# Altium footprint library Connectors.PcbLib: 133 footprints (part 3 of 9)
Each footprint in its own frame and in the unit in brackets; x right, y up, seen from the top. Pads: shape width x height; smd on the part's side, far side on the other; paste and mask are expansions set on the pad; w line width, h text height; cw(c..) or ccw(c..) is an arc to the next point about the centre after c.
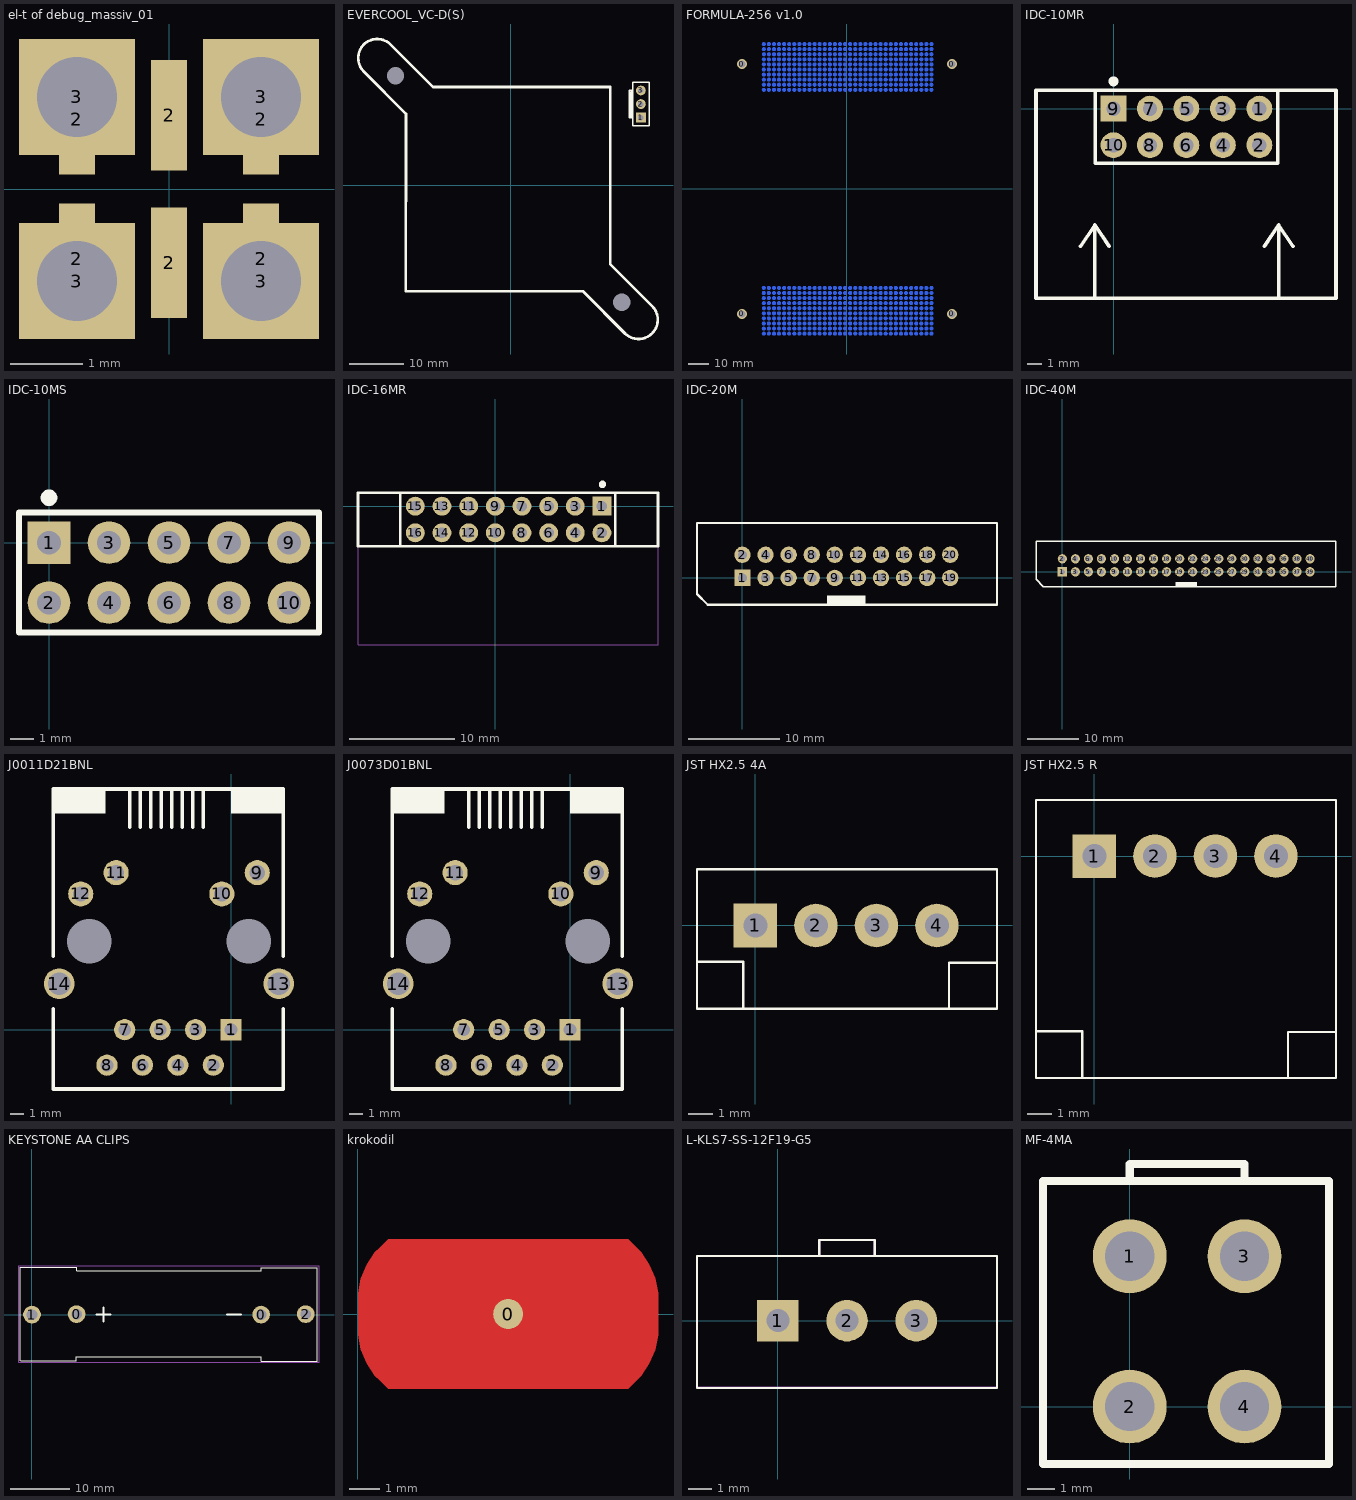
[diagram p2: the footprints below, top view; thin cyan lines are the x and y axes]

## el-t of debug_massiv_01 [mm]
pads (10):
  rect 0.5x1.524 all layers, no hole: 2(-1.27,-0.965) 2(-1.27,0.965) 2(0,-1.016) 2(0,1.016) 2(1.27,-0.965) 2(1.27,0.965)
  rect 1.6x1.6 hole 1.1: 3(-1.27,-1.27) 3(-1.27,1.27) 3(1.27,-1.27) 3(1.27,1.27)

## EVERCOOL_VC-D(S) [mm]
pads (5):
  rect 1.8x1.8 hole 1: 1(24,12.5)
  round 1.8 hole 1: 2(24,15) 3(24,17.5)
  round 0 hole 3.2 unplated mask+1.7: NPTH(-21.219,20.219) NPTH(20.5,-21.5)
Top Overlay:
  lines w0.254: 22.1,17.3 22.1,12.5 22.5,12.5 21.9,12.5 21.9,17.5 22.4,17.5 22.4,12.5 22.2,12.5 22.2,17.5 22.5,17.5 22.5,19 ; 22.5,19 22.5,11 25.5,11 25.5,19 22.5,19
  lines w0.5: -27.079,21.025 cw(c-24.602,23.493) -22.13,25.965 -14.317,18.152 18.334,18.152 18.334,-14.499 26.147,-22.312 cw(c23.561,-24.752) 21.117,-27.334 13.317,-19.507 -19.334,-19.452 -19.278,13.198 -27.079,21.025
3D body "EVERCOOL_40x10_fan.STEP": height 19.92, standoff -5.62, extent -28.045,-28.27 27.203,26.978

## FORMULA-256 v1.0 [mm] "Контактирующее для формулы"
pads (684):
  round 5 hole 3.4: 0(-52.5,-62.57) 0(-52.5,62.43) 0(52.5,-62.57) 0(52.5,62.43)
  round 1.8 smd far side: 1(-41.6,-54.61) 2(-39.06,-54.61) 3(-36.52,-54.61) 4(-33.98,-54.61) 5(-31.44,-54.61) 6(-28.9,-54.61) 7(-26.36,-54.61) 8(-23.82,-54.61) 9(-21.28,-54.61) 10(-18.74,-54.61) 11(-16.2,-54.61) 12(-13.66,-54.61) 13(-11.12,-54.61) 14(-8.58,-54.61) 15(-6.04,-54.61) 16(-3.5,-54.61) 18(1.58,-54.61) 19(4.12,-54.61) 20(6.66,-54.61) 21(9.2,-54.61) 22(11.739,-54.61) 23(14.28,-54.61) 24(16.82,-54.61) 25(19.36,-54.61) 26(21.9,-54.61) 27(24.44,-54.61) 28(26.98,-54.61) 29(29.52,-54.61) 30(32.06,-54.61) 31(34.6,-54.61) 32(37.14,-54.61) 33(39.68,-54.61) 69(42.22,54.61) 70(39.68,54.61) 71(37.14,54.61) 72(34.6,54.61) 73(32.06,54.61) 74(29.52,54.61) 75(26.98,54.61) 76(24.44,54.61) 77(21.9,54.61) 78(19.36,54.61) 79(16.82,54.61) 80(14.28,54.61) 81(11.739,54.61) 82(9.2,54.61) 83(6.66,54.61) 84(4.12,54.61) 86(-0.96,54.61) 87(-3.5,54.61) 88(-6.04,54.61) 89(-8.58,54.61) 90(-11.12,54.61) 91(-13.66,54.61) 92(-16.2,54.61) 93(-18.74,54.61) 94(-21.28,54.61) 95(-23.82,54.61) 96(-26.36,54.61) 97(-28.9,54.61) 98(-31.44,54.61) 99(-33.98,54.61) 100(-36.52,54.61) 101(-39.06,54.61) 137(-41.6,-59.69) 138(-39.06,-59.69) 139(-36.52,-59.69) 140(-33.98,-59.69) 141(-31.44,-59.69) 142(-28.9,-59.69) 143(-26.36,-59.69) 144(-23.82,-59.69) 145(-21.28,-59.69) 146(-18.74,-59.69) 147(-16.2,-59.69) 148(-13.66,-59.69) 149(-11.12,-59.69) 150(-8.58,-59.69) 151(-6.04,-59.69) 152(-3.5,-59.69) 153(-0.96,-59.69) 154(1.58,-59.69) 155(4.12,-59.69) 156(6.66,-59.69) 157(9.2,-59.69) 158(11.739,-59.69) 159(14.28,-59.69) 160(16.82,-59.69) 161(19.36,-59.69) 162(21.9,-59.69) 163(24.44,-59.69) 164(26.98,-59.69) 165(29.52,-59.69) 166(32.06,-59.69) 167(34.6,-59.69) 168(37.14,-59.69) 169(39.68,-59.69) 170(42.22,-59.69) 205(42.22,59.69) 206(39.68,59.69) 207(37.14,59.69) 208(34.6,59.69) 209(32.06,59.69) 210(29.52,59.69) 211(26.98,59.69) 212(24.44,59.69) 213(21.9,59.69) 214(19.36,59.69) 215(16.82,59.69) 216(14.28,59.69) 217(11.739,59.69) 218(9.2,59.69) 219(6.66,59.69) 220(4.12,59.69) 221(1.58,59.69) 222(-0.96,59.69) 223(-3.5,59.69) 224(-6.04,59.69) 225(-8.58,59.69) 226(-11.12,59.69) 227(-13.66,59.69) 228(-16.2,59.69) 229(-18.74,59.69) 230(-21.28,59.69) 231(-23.82,59.69) 232(-26.36,59.69) 233(-28.9,59.69) 234(-31.44,59.69) 235(-33.98,59.69) 236(-36.52,59.69) 237(-39.06,59.69) 238(-41.6,59.69) 273(-41.6,-64.77) 274(-39.06,-64.77) 275(-36.52,-64.77) 276(-33.98,-64.77) 277(-31.44,-64.77) 278(-28.9,-64.77) 279(-26.36,-64.77) 280(-23.82,-64.77) 281(-21.28,-64.77) 282(-18.74,-64.77) 283(-16.2,-64.77) 284(-13.66,-64.77) 285(-11.12,-64.77) 286(-8.58,-64.77) 287(-6.04,-64.77) 288(-3.5,-64.77) 289(-0.96,-64.77) 290(1.58,-64.77) 291(4.12,-64.77) 292(6.66,-64.77) 293(9.2,-64.77) 294(11.739,-64.77) 295(14.28,-64.77) 296(16.82,-64.77) 297(19.36,-64.77) 298(21.9,-64.77) 299(24.44,-64.77) 300(26.98,-64.77) 301(29.52,-64.77) 302(32.06,-64.77) 303(34.6,-64.77) 304(37.14,-64.77) 305(39.68,-64.77) 306(42.22,-64.77) 341(42.22,64.77) 342(39.68,64.77) 343(37.14,64.77) 344(34.6,64.77) 345(32.06,64.77) 346(29.52,64.77) 347(26.98,64.77) 348(24.44,64.77) 349(21.9,64.77) 350(19.36,64.77) 351(16.82,64.77) 352(14.28,64.77) 353(11.739,64.77) 354(9.2,64.77) 355(6.66,64.77) 356(4.12,64.77) 357(1.58,64.77) 358(-0.96,64.77) 359(-3.5,64.77) 360(-6.04,64.77) 361(-8.58,64.77) 362(-11.12,64.77) 363(-13.66,64.77) 364(-16.2,64.77) 365(-18.74,64.77) 366(-21.28,64.77) 367(-23.82,64.77) 368(-26.36,64.77) 369(-28.9,64.77) 370(-31.44,64.77) 371(-33.98,64.77) 372(-36.52,64.77) 373(-39.06,64.77) 374(-41.6,64.77) 409(-41.6,-69.85) 410(-39.06,-69.85) 411(-36.52,-69.85) 412(-33.98,-69.85) 413(-31.44,-69.85) 414(-28.9,-69.85) 415(-26.36,-69.85) 416(-23.82,-69.85) 417(-21.28,-69.85) 418(-18.74,-69.85) 419(-16.2,-69.85) 420(-13.66,-69.85) 421(-11.12,-69.85) 422(-8.58,-69.85) 423(-6.04,-69.85) 424(-3.5,-69.85) 425(-0.96,-69.85) 426(1.58,-69.85) 427(4.12,-69.85) 428(6.66,-69.85) 429(9.2,-69.85) 430(11.739,-69.85) 431(14.28,-69.85) 432(16.82,-69.85) 433(19.36,-69.85) 434(21.9,-69.85) 435(24.44,-69.85) 436(26.98,-69.85) 437(29.52,-69.85) 438(32.06,-69.85) 439(34.6,-69.85) 440(37.14,-69.85) 441(39.68,-69.85) 442(42.22,-69.85) 477(42.22,69.85) 478(39.68,69.85) 479(37.14,69.85) 480(34.6,69.85) 481(32.06,69.85) 482(29.52,69.85) 483(26.98,69.85) 484(24.44,69.85) 485(21.9,69.85) 486(19.36,69.85) 487(16.82,69.85) 488(14.28,69.85) 489(11.739,69.85) 490(9.2,69.85) 491(6.66,69.85) 492(4.12,69.85) 493(1.58,69.85) 494(-0.96,69.85) 495(-3.5,69.85) 496(-6.04,69.85) 497(-8.58,69.85) 498(-11.12,69.85) 499(-13.66,69.85) 500(-16.2,69.85) 501(-18.74,69.85) 502(-21.28,69.85) 503(-23.82,69.85) 504(-26.36,69.85) 505(-28.9,69.85) 506(-31.44,69.85) 507(-33.98,69.85) 508(-36.52,69.85) 509(-39.06,69.85) 510(-41.6,69.85) 545(-41.6,-49.53) 546(-39.06,-49.53) 547(-36.52,-49.53) 548(-33.98,-49.53) 549(-31.44,-49.53) 550(-28.9,-49.53) 551(-26.36,-49.53) 552(-23.82,-49.53) 553(-21.28,-49.53) 554(-18.74,-49.53) 555(-16.2,-49.53) 556(-13.66,-49.53) 557(-11.12,-49.53) 558(-8.58,-49.53) 559(-6.04,-49.53) 560(-3.5,-49.53) 561(-0.96,-49.53) 562(1.58,-49.53) 563(4.12,-49.53) 564(6.66,-49.53) 565(9.2,-49.53) 566(11.739,-49.53) 567(14.28,-49.53) 568(16.82,-49.53) 569(19.36,-49.53) 570(21.9,-49.53) 571(24.44,-49.53) 572(26.98,-49.53) 573(29.52,-49.53) 574(32.06,-49.53) 575(34.6,-49.53) 576(37.14,-49.53) 577(39.68,-49.53) 578(42.22,-49.53) 579(-41.6,-52.07) 580(-39.06,-52.07) 581(-36.52,-52.07) 582(-33.98,-52.07) 583(-31.44,-52.07) 584(-28.9,-52.07) 585(-26.36,-52.07) 586(-23.82,-52.07) 587(-21.28,-52.07) 588(-18.74,-52.07) 589(-16.2,-52.07) 590(-13.66,-52.07) 591(-11.12,-52.07) 592(-8.58,-52.07) 593(-6.04,-52.07) 594(-3.5,-52.07) 595(-0.96,-52.07) 596(1.58,-52.07) 597(4.12,-52.07) 598(6.66,-52.07) 599(9.2,-52.07) 600(11.739,-52.07) 601(14.28,-52.07) 602(16.82,-52.07) 603(19.36,-52.07) 604(21.9,-52.07) 605(24.44,-52.07) 606(26.98,-52.07) 607(29.52,-52.07) 608(32.06,-52.07) 609(34.6,-52.07) 610(37.14,-52.07) 611(39.68,-52.07) 612(42.22,-52.07) 613(42.22,49.53) 614(39.68,49.53) 615(37.14,49.53) 616(34.6,49.53) 617(32.06,49.53) 618(29.52,49.53) 619(26.98,49.53) 620(24.44,49.53) 621(21.9,49.53) 622(19.36,49.53) 623(16.82,49.53) 624(14.28,49.53) 625(11.739,49.53) 626(9.2,49.53) 627(6.66,49.53) 628(4.12,49.53) 629(1.58,49.53) 630(-0.96,49.53) 631(-3.5,49.53) 632(-6.04,49.53) 633(-8.58,49.53) 634(-11.12,49.53) 635(-13.66,49.53) 636(-16.2,49.53) 637(-18.74,49.53) 638(-21.28,49.53) 639(-23.82,49.53) 640(-26.36,49.53) 641(-28.9,49.53) 642(-31.44,49.53) 643(-33.98,49.53) 644(-36.52,49.53) 645(-39.06,49.53) 646(-41.6,49.53) 647(42.22,52.07) 648(39.68,52.07) 649(37.14,52.07) 650(34.6,52.07) 651(32.06,52.07) 652(29.52,52.07) 653(26.98,52.07) 654(24.44,52.07) 655(21.9,52.07) 656(19.36,52.07) 657(16.82,52.07) 658(14.28,52.07) 659(11.739,52.07) 660(9.2,52.07) 661(6.66,52.07) 662(4.12,52.07) 663(1.58,52.07) 664(-0.96,52.07) 665(-3.5,52.07) 666(-6.04,52.07) 667(-8.58,52.07) 668(-11.12,52.07) 669(-13.66,52.07) 670(-16.2,52.07) 671(-18.74,52.07) 672(-21.28,52.07) 673(-23.82,52.07) 674(-26.36,52.07) 675(-28.9,52.07) 676(-31.44,52.07) 677(-33.98,52.07) 678(-36.52,52.07) 679(-39.06,52.07) 680(-41.6,52.07) AGND(-41.6,-72.39) AGND(-41.6,-67.31) AGND(-41.6,-62.23) AGND(-41.6,-57.15) AGND(-41.6,54.61) AGND(-41.6,57.15) AGND(-41.6,62.23) AGND(-41.6,67.31) AGND(-41.6,72.39) AGND(-39.06,-72.39) AGND(-39.06,-67.31) AGND(-39.06,-62.23) AGND(-39.06,-57.15) AGND(-39.06,57.15) AGND(-39.06,62.23) AGND(-39.06,67.31) AGND(-39.06,72.39) AGND(-36.52,-72.39) AGND(-36.52,-67.31) AGND(-36.52,-62.23) AGND(-36.52,-57.15) AGND(-36.52,57.15) AGND(-36.52,62.23) AGND(-36.52,67.31) AGND(-36.52,72.39) AGND(-33.98,-72.39) AGND(-33.98,-67.31) AGND(-33.98,-62.23) AGND(-33.98,-57.15) AGND(-33.98,57.15) AGND(-33.98,62.23) AGND(-33.98,67.31) AGND(-33.98,72.39) AGND(-31.44,-72.39) AGND(-31.44,-67.31) AGND(-31.44,-62.23) AGND(-31.44,-57.15) AGND(-31.44,57.15) AGND(-31.44,62.23) AGND(-31.44,67.31) AGND(-31.44,72.39) AGND(-28.9,-72.39) AGND(-28.9,-67.31) AGND(-28.9,-62.23) AGND(-28.9,-57.15) AGND(-28.9,57.15) AGND(-28.9,62.23) AGND(-28.9,67.31) AGND(-28.9,72.39) AGND(-26.36,-72.39) AGND(-26.36,-67.31) AGND(-26.36,-62.23) AGND(-26.36,-57.15) AGND(-26.36,57.15) AGND(-26.36,62.23) AGND(-26.36,67.31) AGND(-26.36,72.39) AGND(-23.82,-72.39) AGND(-23.82,-67.31) AGND(-23.82,-62.23) AGND(-23.82,-57.15) AGND(-23.82,57.15) AGND(-23.82,62.23) AGND(-23.82,67.31) AGND(-23.82,72.39) AGND(-21.28,-72.39) AGND(-21.28,-67.31) AGND(-21.28,-62.23) AGND(-21.28,-57.15) AGND(-21.28,57.15) AGND(-21.28,62.23) AGND(-21.28,67.31) AGND(-21.28,72.39) AGND(-18.74,-72.39) AGND(-18.74,-67.31) AGND(-18.74,-62.23) AGND(-18.74,-57.15) AGND(-18.74,57.15) AGND(-18.74,62.23) AGND(-18.74,67.31) AGND(-18.74,72.39) AGND(-16.2,-72.39) AGND(-16.2,-67.31) AGND(-16.2,-62.23) AGND(-16.2,-57.15) AGND(-16.2,57.15) AGND(-16.2,62.23) AGND(-16.2,67.31) AGND(-16.2,72.39) AGND(-13.66,-72.39) AGND(-13.66,-67.31) AGND(-13.66,-62.23) AGND(-13.66,-57.15) AGND(-13.66,57.15) AGND(-13.66,62.23) AGND(-13.66,67.31) AGND(-13.66,72.39) AGND(-11.12,-72.39) AGND(-11.12,-67.31) AGND(-11.12,-62.23) AGND(-11.12,-57.15) AGND(-11.12,57.15) AGND(-11.12,62.23) AGND(-11.12,67.31) AGND(-11.12,72.39) AGND(-8.58,-72.39) AGND(-8.58,-67.31) AGND(-8.58,-62.23) AGND(-8.58,-57.15) AGND(-8.58,57.15) AGND(-8.58,62.23) AGND(-8.58,67.31) AGND(-8.58,72.39) AGND(-6.04,-72.39) AGND(-6.04,-67.31) AGND(-6.04,-62.23) AGND(-6.04,-57.15) AGND(-6.04,57.15) AGND(-6.04,62.23) AGND(-6.04,67.31) AGND(-6.04,72.39) AGND(-3.5,-72.39) AGND(-3.5,-67.31) AGND(-3.5,-62.23) AGND(-3.5,-57.15) AGND(-3.5,57.15) AGND(-3.5,62.23) AGND(-3.5,67.31) AGND(-3.5,72.39) AGND(-0.96,-72.39) AGND(-0.96,-67.31) AGND(-0.96,-62.23) AGND(-0.96,-57.15) AGND(-0.96,-54.61) AGND(-0.96,57.15) AGND(-0.96,62.23) AGND(-0.96,67.31) AGND(-0.96,72.39) AGND(1.58,-72.39) AGND(1.58,-67.31) AGND(1.58,-62.23) AGND(1.58,-57.15) AGND(1.58,54.61) AGND(1.58,57.15) AGND(1.58,62.23) AGND(1.58,67.31) AGND(1.58,72.39) AGND(4.12,-72.39) AGND(4.12,-67.31) AGND(4.12,-62.23) AGND(4.12,-57.15) AGND(4.12,57.15) AGND(4.12,62.23) AGND(4.12,67.31) AGND(4.12,72.39) AGND(6.66,-72.39) AGND(6.66,-67.31) AGND(6.66,-62.23) AGND(6.66,-57.15) AGND(6.66,57.15) AGND(6.66,62.23) AGND(6.66,67.31) AGND(6.66,72.39) AGND(9.2,-72.39) AGND(9.2,-67.31) AGND(9.2,-62.23) AGND(9.2,-57.15) AGND(9.2,57.15) AGND(9.2,62.23) AGND(9.2,67.31) AGND(9.2,72.39) AGND(11.739,-72.39) AGND(11.739,-67.31) AGND(11.739,-62.23) AGND(11.739,-57.15) AGND(11.739,57.15) AGND(11.739,62.23) AGND(11.739,67.31) AGND(11.739,72.39) AGND(14.28,-72.39) AGND(14.28,-67.31) AGND(14.28,-62.23) AGND(14.28,-57.15) AGND(14.28,57.15) AGND(14.28,62.23) AGND(14.28,67.31) AGND(14.28,72.39) AGND(16.82,-72.39) AGND(16.82,-67.31) AGND(16.82,-62.23) AGND(16.82,-57.15) AGND(16.82,57.15) AGND(16.82,62.23) AGND(16.82,67.31) AGND(16.82,72.39) AGND(19.36,-72.39) AGND(19.36,-67.31) AGND(19.36,-62.23) AGND(19.36,-57.15) AGND(19.36,57.15) AGND(19.36,62.23) AGND(19.36,67.31) AGND(19.36,72.39) AGND(21.9,-72.39) AGND(21.9,-67.31) AGND(21.9,-62.23) AGND(21.9,-57.15) AGND(21.9,57.15) AGND(21.9,62.23) AGND(21.9,67.31) AGND(21.9,72.39) AGND(24.44,-72.39) AGND(24.44,-67.31) AGND(24.44,-62.23) AGND(24.44,-57.15) AGND(24.44,57.15) AGND(24.44,62.23) AGND(24.44,67.31) AGND(24.44,72.39) AGND(26.98,-72.39) AGND(26.98,-67.31) AGND(26.98,-62.23) AGND(26.98,-57.15) AGND(26.98,57.15) AGND(26.98,62.23) AGND(26.98,67.31) AGND(26.98,72.39) AGND(29.52,-72.39) AGND(29.52,-67.31) AGND(29.52,-62.23) AGND(29.52,-57.15) AGND(29.52,57.15) AGND(29.52,62.23) AGND(29.52,67.31) AGND(29.52,72.39) AGND(32.06,-72.39) AGND(32.06,-67.31) AGND(32.06,-62.23) AGND(32.06,-57.15) AGND(32.06,57.15) AGND(32.06,62.23) AGND(32.06,67.31) AGND(32.06,72.39) AGND(34.6,-72.39) AGND(34.6,-67.31) AGND(34.6,-62.23) AGND(34.6,-57.15) AGND(34.6,57.15) AGND(34.6,62.23) AGND(34.6,67.31) AGND(34.6,72.39) AGND(37.14,-72.39) AGND(37.14,-67.31) AGND(37.14,-62.23) AGND(37.14,-57.15) AGND(37.14,57.15) AGND(37.14,62.23) AGND(37.14,67.31) AGND(37.14,72.39) AGND(39.68,-72.39) AGND(39.68,-67.31) AGND(39.68,-62.23) AGND(39.68,-57.15) AGND(39.68,57.15) AGND(39.68,62.23) AGND(39.68,67.31) AGND(39.68,72.39) AGND(42.22,-72.39) AGND(42.22,-67.31) AGND(42.22,-62.23) AGND(42.22,-57.15) AGND(42.22,-54.61) AGND(42.22,57.15) AGND(42.22,62.23) AGND(42.22,67.31) AGND(42.22,72.39)
Bottom Overlay:
  region: 42.22,-1.27 42.22,3.81 52.38,3.81 52.38,-1.27
  region: 52.38,-3.81 52.38,6.35 57.46,1.27
  lines w0.254: -41.6,-46.99 -41.6,-43.56 ; -41.6,43.56 -41.6,46.99 ; -39.06,-46.99 -39.06,-43.56 ; -39.06,43.56 -39.06,46.99 ; -36.52,-46.99 -36.52,-43.56 ; -36.52,43.56 -36.52,46.99 ; -33.98,-46.99 -33.98,-43.56 ; -33.98,43.56 -33.98,46.99 ; -31.44,-46.99 -31.44,-43.56 ; -31.44,43.56 -31.44,46.99 ; -28.9,-46.99 -28.9,-43.56 ; -28.9,43.56 -28.9,46.99 ; -26.36,-46.99 -26.36,-43.56 ; -26.36,43.56 -26.36,46.99 ; -23.82,-46.99 -23.82,-43.56 ; -23.82,43.56 -23.82,46.99 ; -21.28,-46.99 -21.28,-43.56 ; -21.28,43.56 -21.28,46.99 ; -18.74,-46.99 -18.74,-43.56 ; -18.74,43.56 -18.74,46.99 ; -16.2,-46.99 -16.2,-43.56 ; -16.2,43.56 -16.2,46.99 ; -13.66,-46.99 -13.66,-43.56 ; -13.66,43.56 -13.66,46.99 ; -11.12,-46.99 -11.12,-43.56 ; -11.12,43.56 -11.12,46.99 ; -8.58,-46.99 -8.58,-43.56 ; -8.58,43.56 -8.58,46.99 ; -6.04,-46.99 -6.04,-43.56 ; -6.04,43.56 -6.04,46.99 ; -3.5,-46.99 -3.5,-43.56 ; -3.5,43.56 -3.5,46.99 ; -0.96,-46.99 -0.96,-43.56 ; -0.96,43.56 -0.96,46.99 ; 1.58,-46.99 1.58,-43.56 ; 1.58,43.56 1.58,46.99 ; 4.12,-46.99 4.12,-43.56 ; 4.12,43.56 4.12,46.99 ; 6.66,-46.99 6.66,-43.56 ; 6.66,43.56 6.66,46.99 ; 9.2,-46.99 9.2,-43.56 ; 9.2,43.56 9.2,46.99 ; 11.74,-46.99 11.74,-43.56 ; 11.74,43.56 11.74,46.99 ; 14.28,-46.99 14.28,-43.56 ; 14.28,43.56 14.28,46.99 ; 16.82,-46.99 16.82,-43.56 ; 16.82,43.56 16.82,46.99 ; 19.36,-46.99 19.36,-43.56 ; 19.36,43.56 19.36,46.99 ; 21.9,-46.99 21.9,-43.56 ; 21.9,43.56 21.9,46.99 ; 24.44,-46.99 24.44,-43.56 ; 24.44,43.56 24.44,46.99 ; 26.98,-46.99 26.98,-43.56 ; 26.98,43.56 26.98,46.99 ; 29.52,-46.99 29.52,-43.56 ; 29.52,43.56 29.52,46.99 ; 32.06,-46.99 32.06,-43.56 ; 32.06,43.56 32.06,46.99 ; 34.6,-46.99 34.6,-43.56 ; 34.6,43.56 34.6,46.99 ; 37.14,-46.99 37.14,-43.56 ; 37.14,43.56 37.14,46.99 ; 39.68,-46.99 39.68,-43.56 ; 39.68,43.56 39.68,46.99 ; 42.22,-46.99 42.22,-43.56 ; 42.22,43.56 42.22,46.99 ; -62.5,-75.07 62.5,-75.07 62.5,74.93 -62.5,74.93 -62.5,-75.07
  text "XP19" at -46.68,49.53 h1
  text "XP20" at -46.68,52.07 h1
  text "XP3" at -46.68,54.61 h1
  text "XP4" at -46.68,57.15 h1
  text "XP7" at -46.68,59.69 h1
  text "XP8" at -46.68,62.23 h1
  text "XP11" at -46.68,64.77 h1
  text "XP12" at -46.68,67.31 h1
  text "XP15" at -46.68,69.85 h1
  text "XP16" at -46.68,72.39 h1
  text "XP14" at -46.68,-72.39 h1
  text "XP13" at -46.68,-69.85 h1
  text "XP10" at -46.68,-67.31 h1
  text "XP9" at -46.68,-64.77 h1
  text "XP6" at -46.68,-62.23 h1
  text "XP5" at -46.68,-59.69 h1
  text "XP2" at -46.68,-57.15 h1
  text "XP1" at -46.68,-54.61 h1
  text "XP18" at -46.68,-52.07 h1
  text "XP17" at -46.68,-49.53 h1
  text "2" at 39.68,41.91 h1.52
  text "1" at 42.22,41.91 h1.52
  text "3" at 37.14,41.91 h1.52
  text "4" at 34.6,41.91 h1.52
  text "5" at 32.06,41.91 h1.52
  text "10" at 19.36,41.91 h1.52
  text "9" at 21.9,41.91 h1.52
  text "8" at 24.44,41.91 h1.52
  text "6" at 29.52,41.91 h1.52
  text "7" at 26.98,41.91 h1.52
  text "15" at 6.66,41.91 h1.52
  text "14" at 9.2,41.91 h1.52
  text "13" at 11.74,41.91 h1.52
  text "11" at 16.82,41.91 h1.52
  text "12" at 14.28,41.91 h1.52
  text "20" at -6.04,41.91 h1.52
  text "19" at -3.5,41.91 h1.52
  text "18" at -0.96,41.91 h1.52
  text "16" at 4.12,41.91 h1.52
  text "17" at 1.58,41.91 h1.52
  text "25" at -18.74,41.91 h1.52
  text "24" at -16.2,41.91 h1.52
  text "23" at -13.66,41.91 h1.52
  text "21" at -8.58,41.91 h1.52
  text "22" at -11.12,41.91 h1.52
  text "30" at -31.44,41.91 h1.52
  text "29" at -28.9,41.91 h1.52
  text "28" at -26.36,41.91 h1.52
  text "26" at -21.28,41.91 h1.52
  text "27" at -23.82,41.91 h1.52
  text "34" at -41.6,41.91 h1.52
  text "33" at -39.06,41.91 h1.52
  text "31" at -33.98,41.91 h1.52
  text "32" at -36.52,41.91 h1.52
  text "32" at 37.14,-41.91 h1.52
  text "31" at 34.6,-41.91 h1.52
  text "33" at 39.68,-41.91 h1.52
  text "34" at 42.22,-41.91 h1.52
  text "27" at 24.44,-41.91 h1.52
  text "26" at 21.9,-41.91 h1.52
  text "28" at 26.98,-41.91 h1.52
  text "29" at 29.52,-41.91 h1.52
  text "30" at 32.06,-41.91 h1.52
  text "22" at 11.74,-41.91 h1.52
  text "21" at 9.2,-41.91 h1.52
  text "23" at 14.28,-41.91 h1.52
  text "24" at 16.82,-41.91 h1.52
  text "25" at 19.36,-41.91 h1.52
  text "17" at -0.96,-41.91 h1.52
  text "16" at -3.5,-41.91 h1.52
  text "18" at 1.58,-41.91 h1.52
  text "19" at 4.12,-41.91 h1.52
  text "20" at 6.66,-41.91 h1.52
  text "12" at -13.66,-41.91 h1.52
  text "11" at -16.2,-41.91 h1.52
  text "13" at -11.12,-41.91 h1.52
  text "14" at -8.58,-41.91 h1.52
  text "15" at -6.04,-41.91 h1.52
  text "7" at -26.36,-41.91 h1.52
  text "6" at -28.9,-41.91 h1.52
  text "8" at -23.82,-41.91 h1.52
  text "9" at -21.28,-41.91 h1.52
  text "10" at -18.74,-41.91 h1.52
  text "5" at -31.44,-41.91 h1.52
  text "4" at -33.98,-41.91 h1.52
  text "3" at -36.52,-41.91 h1.52
  text "1" at -41.6,-41.91 h1.52
  text "2" at -39.06,-41.91 h1.52

## IDC-10MR [mm] "угловой разьем на плату"
pads (10):
  round 1.8 hole 1: 1(10.16,0) 2(10.16,-2.54) 3(7.62,0) 4(7.62,-2.54) 5(5.08,0) 6(5.08,-2.54) 7(2.54,0) 8(2.54,-2.54) 10(0,-2.54)
  rect 1.8x1.8 hole 1: 9(0,0)
Top Overlay:
  circle w0.5: c0,1.9 r0.1
  lines w0.254: -2.3,-9.6 -1.3,-8.1 ; -1.3,1.27 -5.4,1.27 -5.4,-13.2 15.5,-13.2 15.5,1.27 11.43,1.27 ; -1.2,-13.2 -1.3,-13.2 -1.3,-8.1 ; -0.3,-9.6 -1.3,-8.1 ; 10.5,-9.6 11.5,-8.1 ; 11.6,-13.2 11.5,-13.2 11.5,-8.1 ; 12.5,-9.6 11.5,-8.1 ; 11.43,1.27 -1.27,1.27 -1.27,-3.81 11.43,-3.81 11.43,1.27
3D body "IDC-10MR разьем.step": height 7.98, standoff -3.37, extent -5.435,-13.233 15.505,0.327

## IDC-10MS [mm]
pads (10):
  rect 1.8x1.8 hole 1: 1(0,0)
  round 1.8 hole 1: 2(0,-2.54) 3(2.54,0) 4(2.54,-2.54) 5(5.08,0) 6(5.08,-2.54) 7(7.62,0) 8(7.62,-2.54) 9(10.16,0) 10(10.16,-2.54)
Top Overlay:
  circle w0.5: c0,1.9 r0.1
  lines w0.254: -1.27,-3.81 11.43,-3.81 11.43,1.27 -1.27,1.27 -1.27,-3.81
3D body "IDC-10MS.STEP": height 9.45, standoff -3.25, extent -5.12,-6.202 15.28,3.148

## IDC-16MR [mm] "угловой разьем на плату"
pads (16):
  rect 1.8x1.8 hole 1: 1(10.16,0)
  round 1.8 hole 1: 2(10.16,-2.54) 3(7.62,0) 4(7.62,-2.54) 5(5.08,0) 6(5.08,-2.54) 7(2.54,0) 8(2.54,-2.54) 9(0,0) 10(0,-2.54) 11(-2.54,0) 12(-2.54,-2.54) 13(-5.08,0) 14(-5.08,-2.54) 15(-7.62,0) 16(-7.62,-2.54)
Top Overlay:
  lines w0.254: -1.3,1.27 -13.081,1.27 -13.081,-3.81 15.5,-3.81 15.5,1.27 11.43,1.27 ; 11.43,1.27 11.43,-3.81 -9.042,-3.81 -9.042,1.27 11.43,1.27
  lines w0.5: 10.311,2.083 cw(c10.211,2.083) 10.311,2.087
Mechanical 29:
  lines w0.1: -13.081,-13.2 15.5,-13.2 15.5,1.27 -13.081,1.27 -13.081,-13.2
  text ".Designator" at -3.5,-7 h1
3D body "User Library-IDC Socket Male 16pin Angled THT Goldplated 2_54mm.STEP": height 8.98, standoff -2.37, extent -13.01,-13.2 15.55,0.36

## IDC-20M [mm]
pads (20):
  rect 1.8x1.8 hole 1: 1(0,0)
  round 1.8 hole 1: 2(0,2.54) 3(2.54,0) 4(2.54,2.54) 5(5.08,0) 6(5.08,2.54) 7(7.62,0) 8(7.62,2.54) 9(10.16,0) 10(10.16,2.54) 11(12.7,0) 12(12.7,2.54) 13(15.24,0) 14(15.24,2.54) 15(17.78,0) 16(17.78,2.54) 17(20.32,0) 18(20.32,2.54) 19(22.86,0) 20(22.86,2.54)
Top Overlay:
  rectangle: 9.3,-2.98 13.55,-1.96
  lines w0.254: -5,-1.77 -5,6.04 28,6.04 28,-2.96 -3.81,-2.96 -5,-1.77
3D body "IDC-20M.step": height 9.63, standoff -2.77, extent -5.07,-2.98 27.93,5.87

## IDC-40M [mm] "угловой разьем на плату"
pads (40):
  rect 1.8x1.8 hole 1: 1(0,0)
  round 1.8 hole 1: 2(0,2.54) 3(2.54,0) 4(2.54,2.54) 5(5.08,0) 6(5.08,2.54) 7(7.62,0) 8(7.62,2.54) 9(10.16,0) 10(10.16,2.54) 11(12.7,0) 12(12.7,2.54) 13(15.24,0) 14(15.24,2.54) 15(17.78,0) 16(17.78,2.54) 17(20.32,0) 18(20.32,2.54) 19(22.86,0) 20(22.86,2.54) 21(25.4,0) 22(25.4,2.54) 23(27.94,0) 24(27.94,2.54) 25(30.48,0) 26(30.48,2.54) 27(33.02,0) 28(33.02,2.54) 29(35.56,0) 30(35.56,2.54) 31(38.1,0) 32(38.1,2.54) 33(40.64,0) 34(40.64,2.54) 35(43.18,0) 36(43.18,2.54) 37(45.72,0) 38(45.72,2.54) 39(48.26,0) 40(48.26,2.54)
Top Overlay:
  rectangle: 22,-2.826 26.25,-1.96
  lines w0.254: -5.131,-1.461 -3.722,-2.87 53.315,-2.87 53.315,5.918 -5.131,5.918 -5.131,-1.461
3D body "IDC-40M.step": height 9.63, standoff -2.77, extent -5.06,-2.977 53.34,5.873

## J0011D21BNL [mm]
height 12
pads (16):
  rect 1.524x1.524 hole 0.9: 1(0,0)
  round 1.524 hole 0.9: 2(-1.27,-2.54) 3(-2.54,0) 4(-3.81,-2.54) 5(-5.08,0) 6(-6.35,-2.54) 7(-7.62,0) 8(-8.89,-2.54)
  round 1.8 hole 1.1: 9(1.88,11.252) 10(-0.66,9.728) 11(-8.23,11.252) 12(-10.77,9.728)
  round 2.2 hole 1.6: 13(3.429,3.302) 14(-12.319,3.302)
  round 0 hole 3.2 unplated mask+1.7: NPTH(-10.16,6.35) NPTH(1.27,6.35)
Top Overlay:
  region: 3.75,17.25 0,17.25 0,15.5 3.75,15.5
  rectangle: -12.75,15.5 -9,17.25
  lines w0.254: -12.75,1.5 -12.75,-4.25 3.75,-4.25 3.75,1.5 ; -12.75,5.25 -12.75,17.25 3.75,17.25 3.75,5.25 ; -7.25,14.5 -7.25,17.25 ; -6.5,14.5 -6.5,17.25 ; -5.75,14.5 -5.75,17.25 ; -5,14.5 -5,17.25 ; -4.25,14.5 -4.25,17.25 ; -3.5,14.5 -3.5,17.25 ; -2.75,14.5 -2.75,17.25 ; -2,14.5 -2,17.25
3D body "J0073D01BNL.STEP": height 13.86, standoff -3.28, extent -12.63,-4.33 3.63,17.26

## J0073D01BNL [mm]
height 12
pads (16):
  rect 1.524x1.524 hole 0.9: 1(0,0)
  round 1.524 hole 0.9: 2(-1.27,-2.54) 3(-2.54,0) 4(-3.81,-2.54) 5(-5.08,0) 6(-6.35,-2.54) 7(-7.62,0) 8(-8.89,-2.54)
  round 1.8 hole 1.1: 9(1.88,11.252) 10(-0.66,9.728) 11(-8.23,11.252) 12(-10.77,9.728)
  round 2.2 hole 1.6: 13(3.429,3.302) 14(-12.319,3.302)
  round 0 hole 3.2 unplated mask+1.7: NPTH(-10.16,6.35) NPTH(1.27,6.35)
Top Overlay:
  region: 3.75,17.25 0,17.25 0,15.5 3.75,15.5
  rectangle: -12.75,15.5 -9,17.25
  lines w0.254: -12.75,1.5 -12.75,-4.25 3.75,-4.25 3.75,1.5 ; -12.75,5.25 -12.75,17.25 3.75,17.25 3.75,5.25 ; -7.25,14.5 -7.25,17.25 ; -6.5,14.5 -6.5,17.25 ; -5.75,14.5 -5.75,17.25 ; -5,14.5 -5,17.25 ; -4.25,14.5 -4.25,17.25 ; -3.5,14.5 -3.5,17.25 ; -2.75,14.5 -2.75,17.25 ; -2,14.5 -2,17.25
3D body "J0073D01BNL.STEP": height 13.86, standoff -3.28, extent -12.63,-4.33 3.63,17.26

## JST HX2.5 4A [mm] "Разьем питания с защелкой"
pads (4):
  rect 1.8x1.8 hole 1: 1(0,0)
  round 1.8 hole 1: 2(2.5,0) 3(5,0) 4(7.5,0)
Top Overlay:
  lines w0.1: -2.4,-1.5 -0.5,-1.5 -0.5,-3.434 ; 8,-3.434 8,-1.534 9.934,-1.534 ; -2.415,-3.434 9.985,-3.434 9.985,2.316 -2.415,2.316 -2.415,-3.434
3D body "HEADER,JST,BxB-XH-A4 PIN JST B4B-XH-A.STEP": height 7, standoff -3.4, extent -2.415,-3.434 9.985,2.316

## JST HX2.5 R [mm] "Разьем питания с защелкой угловой"
pads (4):
  rect 1.8x1.8 hole 1: 1(0,0)
  round 1.8 hole 1: 2(2.5,0) 3(5,0) 4(7.5,0)
Top Overlay:
  lines w0.1: -2.375,-7.25 -0.5,-7.25 -0.5,-9.175 ; 8,-9.175 8,-7.275 9.934,-7.275 ; -2.415,-9.175 -2.415,2.316 9.985,2.316 9.985,-9.175 -2.415,-9.175
3D body "jst-s4b-xh-a-right.step": height 6.55, standoff -2.95, extent -2.475,-9.15 9.925,2.35

## KEYSTONE AA CLIPS [mm]
pads (4):
  round 3 hole 1.8: 0(7.55,0.081) 0(38.8,0) 1(0,0) 2(46.35,0.081)
Top Overlay:
  lines w0.2: -1.964,-7.799 -1.964,8 7.6,8 7.6,7.4 38.8,7.4 38.8,7.9 48.3,7.9 48.3,-7.9 38.8,-7.9 38.8,-7.1 7.5,-7.1 7.5,-7.8 -1.9,-7.8
  lines w0.3: 10.9,0 13.3,0 ; 12.1,-1.2 12.1,1.2 ; 33,0 35.4,0
Mechanical 29:
  lines w0.1: -2.2,-8.1 48.6,-8.1 48.6,8.3 -2.2,8.3 -2.2,-8.1
  text ".Designator" at 18.8,0.7 h1.5
3D body "duracell ultra aa 1_5v mx 1500 lr6.step": height 17.25, standoff 2.75, extent -2,-7.101 48.25,7.4
3D body "AA batery clip keystone 2915 .step": height 16.69, standoff -4.02, extent -1.964,-7.799 7.55,7.961
3D body "AA batery clip keystone 2915 .step": height 16.69, standoff -4.02, extent 38.786,-7.88 48.3,7.88

## krokodil [mm] "Контактная площадка для крокодила с краю платы"
pads (1):
  round 1 all layers, no hole: 0(5.024,0)
Top Layer:
  region: 0.012,0.436 0.012,0.686 0.11,1.177 0.301,1.639 0.579,2.055 0.756,2.232 1.024,2.5 9.024,2.5 9.28,2.244 9.457,2.067 9.735,1.651 9.926,1.189 10.024,0.698 10.024,0.448 10.024,-0.448 10.024,-0.698 9.926,-1.189 9.735,-1.651 9.457,-2.067 9.28,-2.244 9.024,-2.5 1.024,-2.5 0.756,-2.232 0.579,-2.055 0.301,-1.639 0.11,-1.177 0.012,-0.686 0.012,-0.436

## L-KLS7-SS-12F19-G5 [mm]
pads (3):
  rect 1.8x1.8 hole 1: 1(0,0)
  round 1.8 hole 1: 2(3,0) 3(6,0)
Top Overlay:
  lines w0.1: 1.8,2.8 1.8,3.5 4.2,3.5 4.2,2.8 ; -3.503,-2.921 -3.501,2.8 9.499,2.8 9.497,-2.921 -3.503,-2.921
Mechanical 29:
  lines w0.1: 1.8,2.8 1.8,3.5 4.2,3.5 4.2,2.8 ; -3.5,-2.9 -3.5,2.8 9.499,2.8 9.499,-2.9 -3.5,-2.9
  text ".Designator" at 0.5,2 h1
3D body "SK-12F14_G7.STEP": height 6.05, standoff -2.55, extent -3.503,-2.921 9.497,9.279

## MF-4MA [mm] "MINI-FIT питание. 8А макс"
pads (4):
  round 2.7 hole 1.8: 1(0,5.5) 2(0,0) 3(4.2,5.5) 4(4.2,0)
Top Overlay:
  lines w0.3: -3.175,-2.1 -3.175,8.255 7.295,8.255 7.295,-2.1 -3.1,-2.1 ; 0,8.3 0,8.875 4.2,8.875 4.2,8.275
3D body "minifit 4MA.stp": height 13.1, standoff -3.2, extent -3.1,-2.1 7.3,8.9